# Altium footprint library main.PcbLib: 208 footprints (part 4 of 13)
Each footprint in its own frame and in the unit in brackets; x right, y up, seen from the top. Pads: shape width x height; smd on the part's side, far side on the other; paste and mask are expansions set on the pad; w line width, h text height; cw(c..) or ccw(c..) is an arc to the next point about the centre after c.
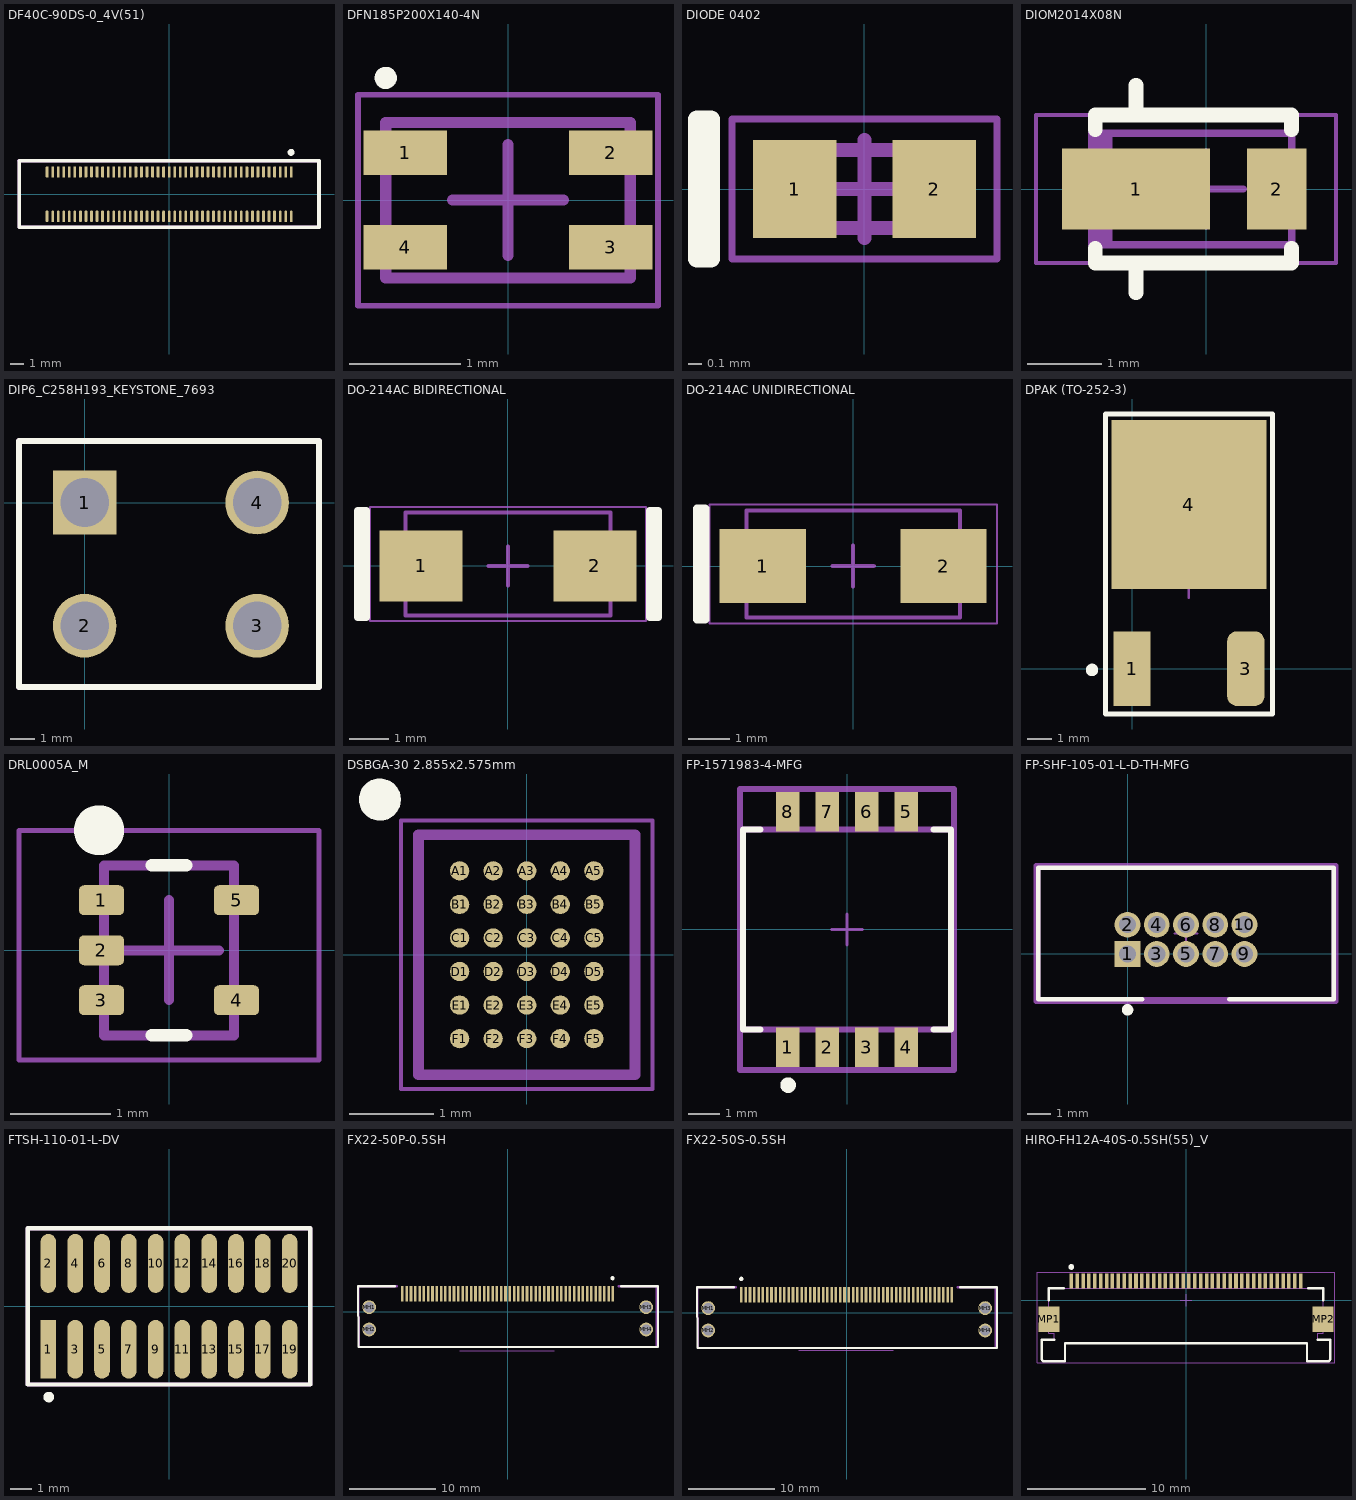
[diagram p3: the footprints below, top view; thin cyan lines are the x and y axes]

## DF40C-90DS-0_4V(51) [mm] "DF40C-90DS-0_4V(51)"
pads (90):
  rect 0.2x0.8 smd: 1(8.8,1.6)
  rrect50% 0.2x0.8 smd: 2(8.8,-1.6) 3(8.4,1.6) 4(8.4,-1.6) 5(8,1.6) 6(8,-1.6) 7(7.6,1.6) 8(7.6,-1.6) 9(7.2,1.6) 10(7.2,-1.6) 11(6.8,1.6) 12(6.8,-1.6) 13(6.4,1.6) 14(6.4,-1.6) 15(6,1.6) 16(6,-1.6) 17(5.6,1.6) 18(5.6,-1.6) 19(5.2,1.6) 20(5.2,-1.6) 21(4.8,1.6) 22(4.8,-1.6) 23(4.4,1.6) 24(4.4,-1.6) 25(4,1.6) 26(4,-1.6) 27(3.6,1.6) 28(3.6,-1.6) 29(3.2,1.6) 30(3.2,-1.6) 31(2.8,1.6) 32(2.8,-1.6) 33(2.4,1.6) 34(2.4,-1.6) 35(2,1.6) 36(2,-1.6) 37(1.6,1.6) 38(1.6,-1.6) 39(1.2,1.6) 40(1.2,-1.6) 41(0.8,1.6) 42(0.8,-1.6) 43(0.4,1.6) 44(0.4,-1.6) 45(0,1.6) 46(0,-1.6) 47(-0.4,1.6) 48(-0.4,-1.6) 49(-0.8,1.6) 50(-0.8,-1.6) 51(-1.2,1.6) 52(-1.2,-1.6) 53(-1.6,1.6) 54(-1.6,-1.6) 55(-2,1.6) 56(-2,-1.6) 57(-2.4,1.6) 58(-2.4,-1.6) 59(-2.8,1.6) 60(-2.8,-1.6) 61(-3.2,1.6) 62(-3.2,-1.6) 63(-3.6,1.6) 64(-3.6,-1.6) 65(-4,1.6) 66(-4,-1.6) 67(-4.4,1.6) 68(-4.4,-1.6) 69(-4.8,1.6) 70(-4.8,-1.6) 71(-5.2,1.6) 72(-5.2,-1.6) 73(-5.6,1.6) 74(-5.6,-1.6) 75(-6,1.6) 76(-6,-1.6) 77(-6.4,1.6) 78(-6.4,-1.6) 79(-6.8,1.6) 80(-6.8,-1.6) 81(-7.2,1.6) 82(-7.2,-1.6) 83(-7.6,1.6) 84(-7.6,-1.6) 85(-8,1.6) 86(-8,-1.6) 87(-8.4,1.6) 88(-8.4,-1.6) 89(-8.8,1.6) 90(-8.8,-1.6)
Top Overlay:
  circle w0.25: c8.79,3.01 r0.125
  lines w0.254: -10.8,-2.4 -10.8,2.4 10.8,2.4 10.8,-2.4 -10.8,-2.4
Mechanical 7:
  text ".Designator" at -7.66,-0.68 h1.52
Mechanical 15:
  lines w0.254: -10.826,2.4 10.8,2.4 10.8,-2.4 -10.781,-2.4 ; -10.8,-2.4 -10.8,2.4
3D body "DF40C-90DS.stp": height 1.4, standoff -0.05, extent -10.3,-1.69 10.3,1.69

## DFN185P200X140-4N [mm] "DFN, 4-Leads, Body 1.20x2.00mm, Pitch 1.85mm, IPC Medium Density"
height 1.4
pads (4):
  rect 0.75x0.4 smd: 1(-0.925,0.425) 2(0.925,0.425) 3(0.925,-0.425) 4(-0.925,-0.425)
Top Overlay:
  circle w0.1: c-1.1,1.1 r0.05
Mechanical 7:
  text ".Designator" at -1.105,-1.119 h1
Mechanical 13:
  lines w0.1: -1.1,-0.7 1.1,-0.7 1.1,0.7 -1.1,0.7 -1.1,-0.7
Mechanical 15:
  lines w0.05: -1.35,-0.95 1.35,-0.95 1.35,0.95 -1.35,0.95 -1.35,-0.95
  lines w0.1: -0.5,0 0.5,0 ; 0,-0.5 0,0.5
3D body "User Library-SRF2012A.STEP": height 1.2, standoff 0.01, extent -1,-0.6 1,0.6

## DIODE 0402 [mm] "DIODE 0402"
height 0.4
pads (2):
  rect 0.6x0.7 smd: 1(-0.5,0) 2(0.5,0)
Top Overlay:
  lines w0.127: -1.2,-0.5 -1.2,0.5 -1.1,0.5 -1.1,-0.5 -1.2,-0.5
Mechanical 7:
  text ".Designator" at -0.66,-0.28 h0.76
Mechanical 13:
  lines w0.1: -0.53,-0.28 -0.53,0.28 0.53,0.28 0.53,-0.28 -0.53,-0.28
Mechanical 15:
  lines w0.05: -0.95,-0.5 -0.95,0.5 0.95,0.5 0.95,-0.5 -0.95,-0.5
  lines w0.1: -0.35,0 0.35,0 ; 0,-0.35 0,0.35
3D body "YAG_R0402_YAG.step": height 0.41, standoff 0, extent -0.533,-0.279 0.533,0.279

## DIOM2014X08N [mm] "RHOM TUMD2M - Molded Diode, 2-Leads, Body 2.00x1.40mm, IPC Medium Density"
height 0.8
pads (2):
  rect 2x1.1 smd: 1(-0.95,0)
  rect 0.8x1.1 smd: 2(0.95,0)
Top Overlay:
  lines w0.2: -1.5,-0.8 -1.5,-1 1.15,-1 1.15,-0.8 ; -1.5,0.8 -1.5,1 1.15,1 1.15,0.8 ; -0.95,-1.4 -0.95,-1 ; -0.95,1 -0.95,1.4
Mechanical 7:
  text ".Designator" at -3.4,-0.7 h1.52
Mechanical 13:
  rectangle: -1.55,-0.75 -1.268,0.75
  lines w0.1: -1.55,-0.75 -1.55,0.75 1.15,0.75 1.15,-0.75 -1.55,-0.75
Mechanical 15:
  lines w0.05: -2.3,-1 -2.3,1 1.75,1 1.75,-1 -2.3,-1
  lines w0.1: -0.5,0 0.5,0 ; 0,-0.5 0,0.5
3D body: height 0.8, standoff 0, extent -1.55,-0.75 0.55,0.75

## DIP6_C258H193_KEYSTONE_7693 [mil]
height 250
pads (4):
  rect 102x102 hole 78: 1(0,0)
  round 102 hole 78: 2(0,-197) 3(276,-197) 4(276,0)
Top Overlay:
  lines w10: -105,-295 -105,98.5 375,98.5 375,-295 -105,-295
Mechanical 7:
  text ".Designator" at -30,-125 h60
Mechanical 15:
  lines w10: -105,-295 375,-295 375,98.5 -105,98.5 -105,-295
3D body "keystone-PN7693.STEP": height 327.21, standoff -187.21, extent -43.02,-255 313.01,55

## DO-214AC BIDIRECTIONAL [mm] "DO-214AC BIDIRECTIONAL"
height 0.65
pads (2):
  rect 2.1x1.8 smd: 1(-2.2,0) 2(2.2,0)
Top Overlay:
  lines w0.2: -3.8,-1.3 -3.8,1.4 -3.6,1.4 -3.6,-1.3 -3.8,-1.3 ; 3.6,-1.3 3.6,1.4 3.8,1.4 3.8,-1.3 3.6,-1.3
Mechanical 7:
  text ".Designator" at -1.325,-0.454 h0.76
Mechanical 13:
  lines w0.1: -2.6,-1.25 -2.6,1.35 2.6,1.35 2.6,-1.25 -2.6,-1.25
Mechanical 15:
  lines w0.05: -3.5,-1.4 3.5,-1.4 3.5,1.5 -3.5,1.5 -3.5,-1.4
  lines w0.1: -0.5,0 0.5,0 ; 0,-0.5 0,0.5
3D body "User Library-DO-214AC SMA.step": height 2.4, standoff 0, extent -2.6,-1.25 2.6,1.35

## DO-214AC UNIDIRECTIONAL [mm] "DO-214AC UNIDIRECTIONAL"
height 0.65
pads (2):
  rect 2.1x1.8 smd: 1(-2.2,0) 2(2.2,0)
Top Overlay:
  lines w0.2: -3.8,-1.3 -3.6,-1.3 -3.6,1.4 -3.8,1.4 -3.8,-1.3
Mechanical 7:
  text ".Designator" at -1.325,-0.454 h0.76
Mechanical 13:
  lines w0.1: -2.6,-1.25 2.6,-1.25 2.6,1.35 -2.6,1.35 -2.6,-1.25
Mechanical 15:
  lines w0.05: -3.5,-1.4 -3.5,1.5 3.5,1.5 3.5,-1.4 -3.5,-1.4
  lines w0.1: -0.5,0 0.5,0 ; 0,-0.5 0,0.5
3D body "User Library-DO-214AC SMA.step": height 2.4, standoff 0, extent -2.6,-1.25 2.6,1.35

## DPAK (TO-252-3) [mm] "DPAK (TO-252-3)"
height 1.1
pads (3):
  rect 1.5x3 smd: 1(0,0)
  rrect50% 1.5x3 smd: 3(4.58,0)
  rect 6.25x6.8 smd: 4(2.29,6.6)
Top Overlay:
  circle w0.25: c-1.61,-0.05 r0.125
  lines w0.2: -1.075,-1.825 -1.075,10.25 5.65,10.25 5.65,-1.825 -1.075,-1.825
Mechanical 15:
  lines w0.1: 1.79,3.35 2.79,3.35 ; 2.29,2.85 2.29,3.85
3D body "User Library-DPAK-1.step": height 2.34, standoff -0.07, extent -0.975,-0.4 5.565,9.538

## DRL0005A_M [mm] "SOT23, 5-Leads, Body 1.7x1.3mm, Pitch 0.5mm, IPC Low Density"
height 0.6
pads (5):
  rrect33% 0.45x0.3 smd mask+0.05: 1(-0.675,0.5) 2(-0.675,0) 3(-0.675,-0.5) 4(0.675,-0.5) 5(0.675,0.5)
Top Overlay:
  circle w0.25: c-0.7,1.2 r0.125
  lines w0.125: -0.175,-0.85 0.175,-0.85 ; -0.175,0.85 0.175,0.85
Mechanical 7:
  text ".Designator" at -1.31,-0.79 h0.3
Mechanical 13:
  lines w0.1: -0.65,-0.85 -0.65,0.85 0.65,0.85 0.65,-0.85 -0.65,-0.85
Mechanical 15:
  lines w0.05: -1.5,-1.1 -1.5,1.2 1.5,1.2 1.5,-1.1 -1.5,-1.1
  lines w0.1: -0.5,0 0.5,0 ; 0,-0.5 0,0.5
3D body: height 0.6, standoff 0, extent -0.65,-0.85 0.65,0.85

## DSBGA-30 2.855x2.575mm [mm] "DSBGA-30 2.855x2.675mm"
pads (30):
  round 0.23 smd mask+0.05: A1(-0.8,1) A2(-0.4,1) A3(0,1) A4(0.4,1) A5(0.8,1) B1(-0.8,0.6) B2(-0.4,0.6) B3(0,0.6) B4(0.4,0.6) B5(0.8,0.6) C1(-0.8,0.2) C2(-0.4,0.2) C3(0,0.2) C4(0.4,0.2) C5(0.8,0.2) D1(-0.8,-0.2) D2(-0.4,-0.2) D3(0,-0.2) D4(0.4,-0.2) D5(0.8,-0.2) E1(-0.8,-0.6) E2(-0.4,-0.6) E3(0,-0.6) E4(0.4,-0.6) E5(0.8,-0.6) F1(-0.8,-1) F2(-0.4,-1) F3(0,-1) F4(0.4,-1) F5(0.8,-1)
Top Overlay:
  circle w0.25: c-1.75,1.85 r0.125
Mechanical 7:
  text ".Designator" at -0.8,-0.5 h1.52
Mechanical 13:
  lines w0.127: -1.29,-1.43 -1.29,1.43 1.29,1.43 1.29,-1.43 -1.29,-1.43
  lines w0.2: -1.75,1.85 ccw(c-1.847,1.876) -1.747,1.865
Mechanical 15:
  lines w0.05: -1.5,-1.6 -1.5,1.6 1.5,1.6 1.5,-1.6 -1.5,-1.6
3D body: height 0.33, standoff 0, extent -1.29,-1.43 1.29,1.43

## FP-1571983-4-MFG [mm]
pads (8):
  rect 0.76x1.27 smd: 1(-1.905,-3.795) 2(-0.635,-3.795) 3(0.635,-3.795) 4(1.905,-3.795) 5(1.905,3.795) 6(0.635,3.795) 7(-0.635,3.795) 8(-1.905,3.795)
Top Overlay:
  circle w0.25: c-1.9,-5.02 r0.125
  lines w0.2: -2.8,-3.225 -3.355,-3.225 -3.355,3.225 -2.8,3.225 ; 2.8,-3.225 3.355,-3.225 3.355,3.225 2.8,3.225
Mechanical 7:
  text ".Designator" at -2.835,-2.131 h1.52
Mechanical 13:
  lines w0.2: -3.355,-3.225 -3.355,3.225 3.355,3.225 3.355,-3.225 -3.355,-3.225
Mechanical 15:
  lines w0.1: -0.5,0 0.5,0 ; 0,-0.5 0,0.5
  lines w0.2: -3.455,-4.53 -3.455,4.53 3.455,4.53 3.455,-4.53 -3.455,-4.53
3D body "Switch_TE_Connectivity_1571983-4_eec.STEP": height 0.25, standoff 0, extent -3.455,-4.53 3.455,4.53

## FP-SHF-105-01-L-D-TH-MFG [mm]
pads (10):
  rect 1.12x1.12 hole 0.74 paste-1000 mask+0: 1(0,0)
  round 1.12 hole 0.74 paste-1000 mask+0: 2(0,1.27) 3(1.27,0) 4(1.27,1.27) 5(2.54,0) 6(2.54,1.27) 7(3.81,0) 8(3.81,1.27) 9(5.08,0) 10(5.08,1.27)
Top Overlay:
  circle w0.25: c0,-2.425 r0.125
  lines w0.2: 0.64,-1.97 -3.875,-1.97 -3.875,3.75 8.955,3.75 8.955,-1.97 ; 4.425,-1.97 8.94,-1.97
Mechanical 7:
  text ".Designator" at -1.695,-0.541 h1.52
Mechanical 13:
  lines w0.2: -3.875,-1.97 8.955,-1.97 8.955,3.75 -3.875,3.75 -3.875,-1.97
Mechanical 15:
  lines w0.2: -3.975,-2.07 9.055,-2.07 9.055,3.85 -3.975,3.85 -3.975,-2.07
Mechanical 16:
  lines w0.1: 2.04,0.89 3.04,0.89 ; 2.54,0.39 2.54,1.39
3D body "Conn_Samtec_SHF-105-01-L-D-TH_eec.STEP": height 0.25, standoff 0, extent -3.975,-2.07 9.055,3.85

## FTSH-110-01-L-DV [mm] "FTSH-110-01-L-DV"
height 5.4
pads (20):
  rect 0.74x2.79 smd paste-1000 mask+0: 1(-5.715,-2.035)
  oval 0.74x2.79 smd paste-1000 mask+0: 2(-5.715,2.035) 3(-4.445,-2.035) 4(-4.445,2.035) 5(-3.175,-2.035) 6(-3.175,2.035) 7(-1.905,-2.035) 8(-1.905,2.035) 9(-0.635,-2.035) 10(-0.635,2.035) 11(0.635,-2.035) 12(0.635,2.035) 13(1.905,-2.035) 14(1.905,2.035) 15(3.175,-2.035) 16(3.175,2.035) 17(4.445,-2.035) 18(4.445,2.035) 19(5.715,-2.035) 20(5.715,2.035)
Top Overlay:
  circle w0.25: c-5.7,-4.3 r0.125
  lines w0.2: -6.7,-3.7 6.7,-3.7 6.7,3.7 -6.7,3.7 -6.7,-3.7
Mechanical 7:
  text ".Designator" at -7.409,-1.172 h1.52
Mechanical 13:
  lines w0.2: -6.7,-3.7 6.7,-3.7 6.7,3.7 -6.7,3.7 -6.7,-3.7
Mechanical 15:
  lines w0.2: -6.7,-3.7 6.7,-3.7 6.7,3.7 -6.7,3.7 -6.7,-3.7
3D body "FTSH-110-01-L-DV.stp": height 5.96, standoff -0.01, extent -6.35,-2.921 6.35,2.921

## FX22-50P-0.5SH [mm] "FX22-50P-0.5SH"
pads (54):
  rect 0.3x1.8 smd: 1(12.25,2.075) 2(11.75,2.075) 3(11.25,2.075) 4(10.75,2.075) 5(10.25,2.075) 6(9.75,2.075) 7(9.25,2.075) 8(8.75,2.075) 9(8.25,2.075) 10(7.75,2.075) 11(7.25,2.075) 12(6.75,2.075) 13(6.25,2.075) 14(5.75,2.075) 15(5.25,2.075) 16(4.75,2.075) 17(4.25,2.075) 18(3.75,2.075) 19(3.25,2.075) 20(2.75,2.075) 21(2.25,2.075) 22(1.75,2.075) 23(1.25,2.075) 24(0.75,2.075) 25(0.25,2.075) 26(-0.25,2.075) 27(-0.75,2.075) 28(-1.25,2.075) 29(-1.75,2.075) 30(-2.25,2.075) 31(-2.75,2.075) 32(-3.25,2.075) 33(-3.75,2.075) 34(-4.25,2.075) 35(-4.75,2.075) 36(-5.25,2.075) 37(-5.75,2.075) 38(-6.25,2.075) 39(-6.75,2.075) 40(-7.25,2.075) 41(-7.75,2.075) 42(-8.25,2.075) 43(-8.75,2.075) 44(-9.25,2.075) 45(-9.75,2.075) 46(-10.25,2.075) 47(-10.75,2.075) 48(-11.25,2.075) 49(-11.75,2.075) 50(-12.25,2.075)
  round 1.6 hole 1.2: MH1(-16.125,0.525) MH2(-16.125,-2.075) MH3(16.125,0.525) MH4(16.125,-2.075)
Top Overlay:
  circle w0.25: c12.2,3.9 r0.125
  lines w0.254: -13.1,2.964 -17.424,2.964 -17.358,-4.1 17.5,-4.1 17.5,2.964 13.2,2.964
Mechanical 5:
  lines w0.1: -5.6,-4.575 5.4,-4.575
  text "PCB EDGE" at 5.6,-4 h1
Mechanical 7:
  text ".Designator" at -5.779,-3.111 h1.52
Mechanical 15:
  lines w0.254: -12.885,2.964 -17.362,2.964 -17.296,-4.1 17.362,-4.1 17.362,2.964 12.927,2.964
3D body "FX22-50P-0.5SH.stp": height 4.2, standoff -1.35, extent -16.74,-10.759 16.76,2.891

## FX22-50S-0.5SH [mm] "FX22-50S-0.5SH"
pads (54):
  rect 0.3x1.8 smd: 1(-12.25,2.075) 2(-11.75,2.075) 3(-11.25,2.075) 4(-10.75,2.075) 5(-10.25,2.075) 6(-9.75,2.075) 7(-9.25,2.075) 8(-8.75,2.075) 9(-8.25,2.075) 10(-7.75,2.075) 11(-7.25,2.075) 12(-6.75,2.075) 13(-6.25,2.075) 14(-5.75,2.075) 15(-5.25,2.075) 16(-4.75,2.075) 17(-4.25,2.075) 18(-3.75,2.075) 19(-3.25,2.075) 20(-2.75,2.075) 21(-2.25,2.075) 22(-1.75,2.075) 23(-1.25,2.075) 24(-0.75,2.075) 25(-0.25,2.075) 26(0.25,2.075) 27(0.75,2.075) 28(1.25,2.075) 29(1.75,2.075) 30(2.25,2.075) 31(2.75,2.075) 32(3.25,2.075) 33(3.75,2.075) 34(4.25,2.075) 35(4.75,2.075) 36(5.25,2.075) 37(5.75,2.075) 38(6.25,2.075) 39(6.75,2.075) 40(7.25,2.075) 41(7.75,2.075) 42(8.25,2.075) 43(8.75,2.075) 44(9.25,2.075) 45(9.75,2.075) 46(10.25,2.075) 47(10.75,2.075) 48(11.25,2.075) 49(11.75,2.075) 50(12.25,2.075)
  round 1.6 hole 1.2: MH1(-16.125,0.525) MH2(-16.125,-2.075) MH3(16.125,0.525) MH4(16.125,-2.075)
Top Overlay:
  circle w0.25: c-12.271,3.93 r0.125
  lines w0.254: -13.1,2.964 -17.424,2.964 -17.358,-4.1 17.5,-4.1 17.5,2.964 13.2,2.964
Mechanical 5:
  lines w0.1: -5.6,-4.375 5.4,-4.375
  text "PCB EDGE" at 5.6,-4 h1
Mechanical 7:
  text ".Designator" at -5.779,-3.111 h1.52
Mechanical 15:
  lines w0.254: -12.885,2.964 -17.362,2.964 -17.296,-4.1 17.362,-4.1 17.362,2.964 12.927,2.964
3D body "FX22-50S-0.5SH.stp": height 4.25, standoff -1.3, extent -16.74,-4.14 16.76,2.71

## HIRO-FH12A-40S-0.5SH(55)_V [mm] "SMD, 40-Leads, Body 24.5x6.2mm, Pitch 0.5mm"
height 2
pads (42):
  rect 0.3x1.3 smd paste-0.025: 1(-9.75,1.625) 2(-9.25,1.625) 3(-8.75,1.625) 4(-8.25,1.625) 5(-7.75,1.625) 6(-7.25,1.625) 7(-6.75,1.625) 8(-6.25,1.625) 9(-5.75,1.625) 10(-5.25,1.625) 11(-4.75,1.625) 12(-4.25,1.625) 13(-3.75,1.625) 14(-3.25,1.625) 15(-2.75,1.625) 16(-2.25,1.625) 17(-1.75,1.625) 18(-1.25,1.625) 19(-0.75,1.625) 20(-0.25,1.625) 21(0.25,1.625) 22(0.75,1.625) 23(1.25,1.625) 24(1.75,1.625) 25(2.25,1.625) 26(2.75,1.625) 27(3.25,1.625) 28(3.75,1.625) 29(4.25,1.625) 30(4.75,1.625) 31(5.25,1.625) 32(5.75,1.625) 33(6.25,1.625) 34(6.75,1.625) 35(7.25,1.625) 36(7.75,1.625) 37(8.25,1.625) 38(8.75,1.625) 39(9.25,1.625) 40(9.75,1.625)
  rect 1.8x2.2 smd: MP1(-11.65,-1.625) MP2(11.65,-1.625)
Top Overlay:
  circle w0.25: c-9.75,2.825 r0.125
  lines w0.2: -11.675,-0.025 -11.675,1 -10.4,1 ; -11.2,-3.35 -12.25,-3.35 -12.25,-5 ccw(c-12.05,-5) -12.05,-5.2 -10.285,-5.2 -10.285,-3.67 10.285,-3.67 10.285,-5.2 12.05,-5.2 ccw(c12.05,-5) 12.25,-5 12.25,-3.35 11.2,-3.35 ; 10.4,1 11.675,1 11.675,-0.025
Mechanical 7:
  text ".Designator" at -6.994,-3.15 h1.52
Mechanical 13:
  lines w0.1: -12.25,-5 ccw(c-12.05,-5) -12.05,-5.2 -10.285,-5.2 -10.285,-3.67 10.285,-3.67 10.285,-5.2 12.05,-5.2 ccw(c12.05,-5) 12.25,-5 12.25,-3.35 11.2,-3.35 11.2,-2.8 11.675,-2.8 11.675,1 -11.675,1 -11.675,-2.8 -11.2,-2.8 -11.2,-3.35 -12.25,-3.35 -12.25,-5
Mechanical 15:
  lines w0.05: -12.65,-5.3 -12.65,2.375 12.65,2.375 12.65,-5.3 -12.65,-5.3
  lines w0.1: -0.5,0 0.5,0 ; 0,-0.5 0,0.5
3D body "FH12A-40S-0.5SH.stp": height 2.15, standoff 0, extent -12.25,-5.2 12.25,1.8